# Altium footprint library Switches.PcbLib: 117 footprints (part 5 of 8)
Each footprint in its own frame and in the unit in brackets; x right, y up, seen from the top. Pads: shape width x height; smd on the part's side, far side on the other; paste and mask are expansions set on the pad; w line width, h text height; cw(c..) or ccw(c..) is an arc to the next point about the centre after c.
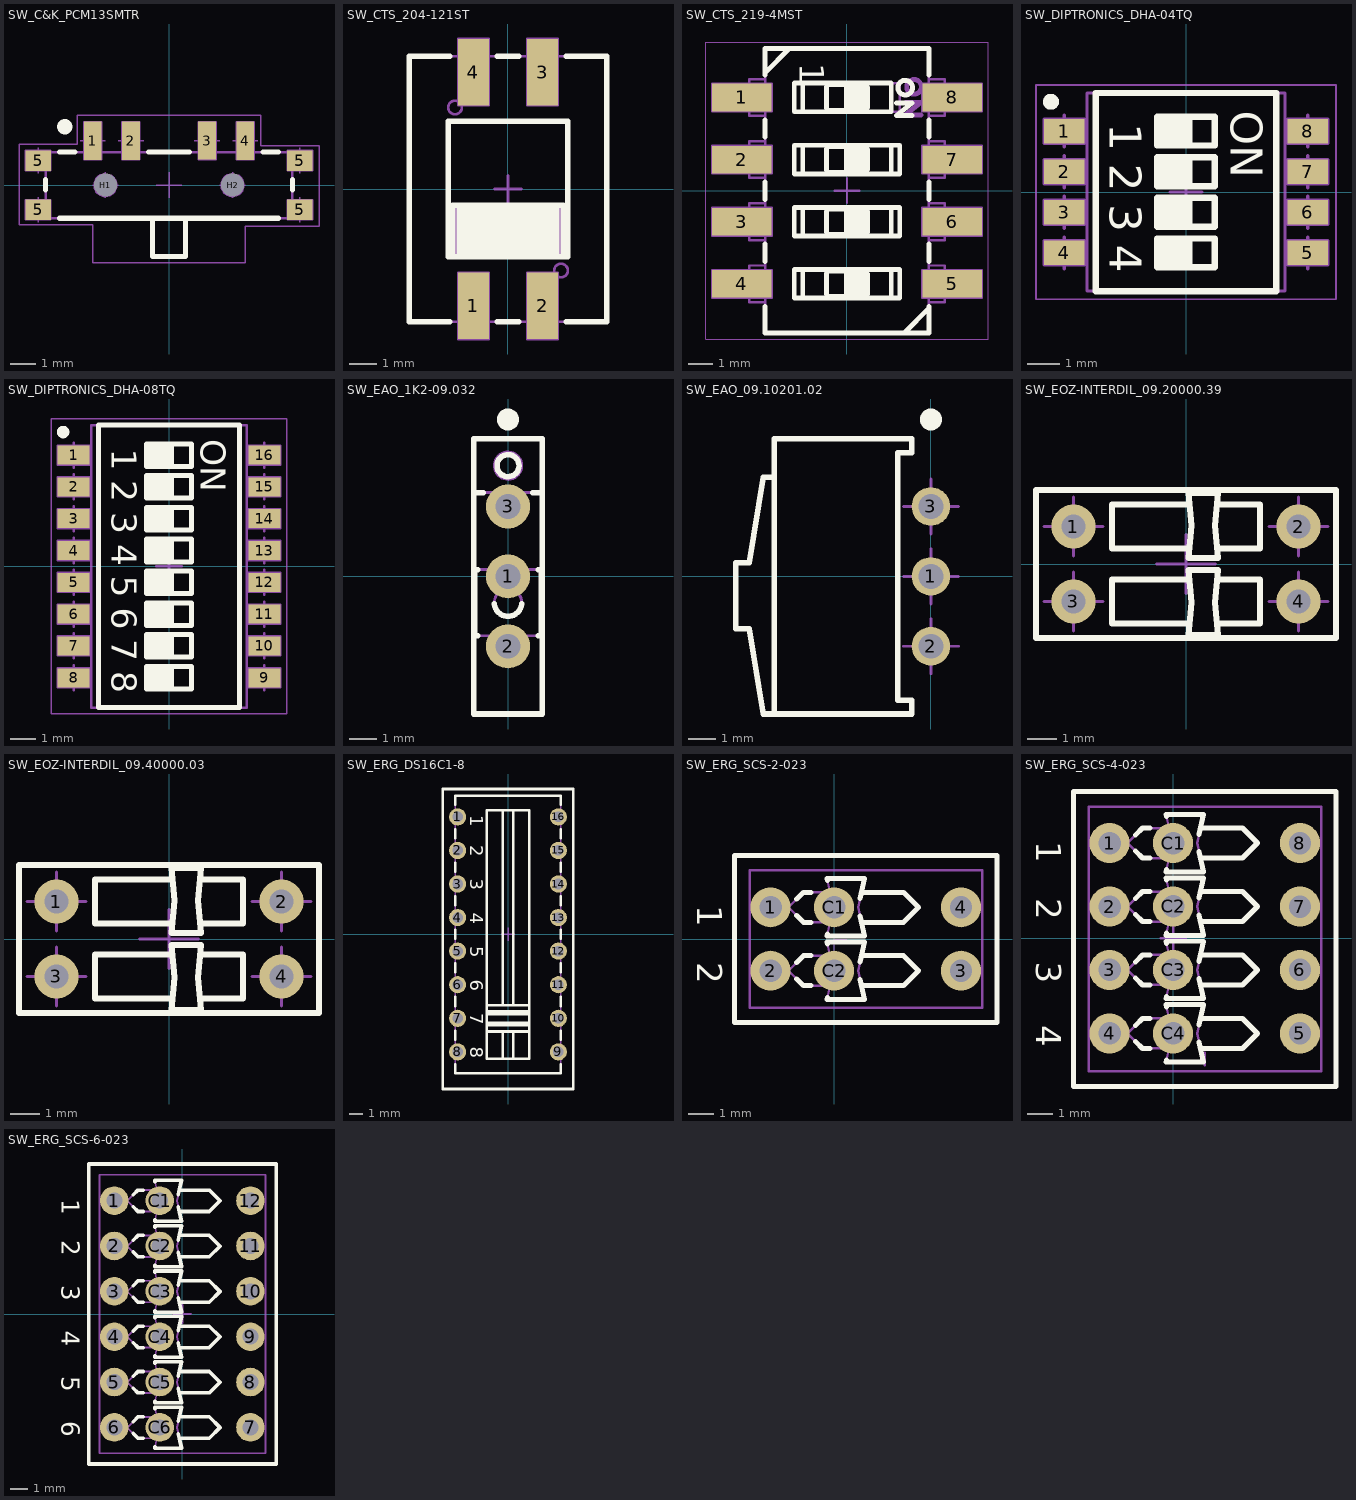
[diagram p4: the footprints below, top view; thin cyan lines are the x and y axes]

## SW_C&K_PCM13SMTR [mm] "SP3T, Right Angled Ultraminiature Surface Mount Slide Switches, C&K PCM Series"
height 1.4
pads (10):
  rect 0.7x1.5 smd: 1(-3,1.75) 2(-1.5,1.75) 3(1.5,1.754) 4(3,1.75)
  rect 1x0.8 smd: 5(-5.15,-0.965) 5(-5.15,0.965) 5(5.15,-0.965) 5(5.15,0.965)
  round 0.5 hole 0.9 unplated mask+0.2: H1(-2.5,0) H2(2.5,0)
Top Overlay:
  circle w0.3: c-4.1,2.3 r0.15
  lines w0.2: -4.85,-0.192 -4.85,0.215 ; -4.3,-1.3 4.3,-1.3 ; -4.3,1.3 -3.7,1.3 ; -0.8,1.3 0.8,1.3 ; -0.65,-1.3 -0.65,-2.8 0.65,-2.8 0.65,-1.3 ; 3.7,1.3 4.3,1.3 ; 4.85,-0.192 4.85,0.215
Mechanical 8:
  circle w0.05: c2.5,0 r0.45
  circle w0.05: c-2.5,0 r0.45
  lines w0.05: -5.65,-0.965 -5.15,-0.965 ; -5.65,0.965 -5.15,0.965 ; -5.15,-1.465 -5.15,-0.965 ; -5.15,-0.465 -5.15,-0.965 ; -5.15,0.465 -5.15,0.965 ; -5.15,1.465 -5.15,0.965 ; -4.65,-0.965 -5.15,-0.965 ; -4.65,0.965 -5.15,0.965 ; -3.5,1.75 -3,1.75 ; -3,0 -2.5,0 ; -3,1.25 -3,1.75 ; -3,2.25 -3,1.75 ; -2.5,-0.5 -2.5,0 ; -2.5,0.5 -2.5,0 ; -2.5,1.75 -3,1.75 ; -2,0 -2.5,0 ; -2,1.75 -1.5,1.75 ; -1.5,1.25 -1.5,1.75 ; -1.5,2.25 -1.5,1.75 ; -1,1.75 -1.5,1.75 ; -0.5,0 0,0 ; 0,-0.5 0,0 ; 0,0.5 0,0 ; 0.5,0 0,0 ; 1,1.754 1.5,1.754 ; 1.5,1.254 1.5,1.754 ; 1.5,2.254 1.5,1.754 ; 2,0 2.5,0 ; 2,1.754 1.5,1.754 ; 2.5,-0.5 2.5,0 ; 2.5,0.5 2.5,0 ; 2.5,1.75 3,1.75 ; 3,0 2.5,0 ; 3,1.25 3,1.75 ; 3,2.25 3,1.75 ; 3.5,1.75 3,1.75 ; 4.65,-0.965 5.15,-0.965 ; 4.65,0.965 5.15,0.965 ; 5.15,-1.465 5.15,-0.965 ; 5.15,-0.465 5.15,-0.965 ; 5.15,0.465 5.15,0.965 ; 5.15,1.465 5.15,0.965 ; 5.65,-0.965 5.15,-0.965 ; 5.65,0.965 5.15,0.965 ; -5.65,-1.365 -4.65,-1.365 -4.65,-0.565 -5.65,-0.565 -5.65,-1.365 ; -5.65,0.565 -5.65,1.365 -4.65,1.365 -4.65,0.565 -5.65,0.565 ; -3.35,1 -3.35,2.5 -2.65,2.5 -2.65,1 -3.35,1 ; -1.85,1 -1.85,2.5 -1.15,2.5 -1.15,1 -1.85,1 ; 1.15,1 1.15,2.5 1.85,2.5 1.85,1 1.15,1 ; 2.65,1 2.65,2.5 3.35,2.5 3.35,1 2.65,1 ; 4.65,-1.365 4.65,-0.565 5.65,-0.565 5.65,-1.365 4.65,-1.365 ; 4.65,0.565 4.65,1.365 5.65,1.365 5.65,0.565 4.65,0.565
Mechanical 14:
  lines w0.1: -4.85,-0.64 -5.35,-0.64 -5.35,-1.3 -4.85,-1.3 ; -4.85,0.64 -5.35,0.64 -5.35,1.3 -4.85,1.3 ; -3.2,1.3 -3.2,2.2 -2.8,2.2 -2.8,1.3 ; -1.7,1.3 -1.7,2.2 -1.3,2.2 -1.3,1.3 ; -0.65,-1.3 -0.65,-2.8 0.65,-2.8 0.65,-1.3 ; 1.3,1.3 1.3,2.2 1.7,2.2 1.7,1.3 ; 2.8,1.3 2.8,2.2 3.2,2.2 3.2,1.3 ; 4.85,-0.64 5.35,-0.64 5.35,-1.3 4.85,-1.3 ; 4.85,0.64 5.35,0.64 5.35,1.3 4.85,1.3 ; -4.85,-1.3 -4.85,1.3 ; -4.85,-1.3 4.85,-1.3 ; -4.85,1.3 4.85,1.3 ; 4.85,-1.3 4.85,1.3
Mechanical 15:
  lines w0.05: -5.9,-1.55 -5.9,1.615 -3.6,1.615 -3.6,2.75 3.6,2.75 3.6,1.55 5.9,1.55 5.9,-1.615 3,-1.615 3,-3.05 -3,-3.05 -3,-1.55 -5.9,-1.55
3D body "SW_C&K_PCM13SMTR.stp": height 1.4, standoff -0.5, extent -5.35,-2.8 5.35,2.2

## SW_CTS_204-121ST [mm] "Body 7.26 x 9.78mm SPST DIP Switch, 204 Series"
height 10.36
pads (4):
  rect 1.13x2.44 smd: 1(-1.27,-4.3) 2(1.27,-4.3) 3(1.27,4.3) 4(-1.27,4.3)
Top Overlay:
  lines w0.2: -2.135,-4.89 -3.63,-4.89 -3.63,4.89 -2.135,4.89 ; -2.03,-2.5 -2.03,-0.6 2.03,-0.6 2.03,-2.5 ; -1.8,-2.5 -1.8,-0.6 ; -1.6,-2.5 -1.6,-0.6 ; -1.4,-2.5 -1.4,-0.6 ; -1.2,-2.5 -1.2,-0.6 ; -1,-2.5 -1,-0.6 ; -0.8,-2.5 -0.8,-0.6 ; -0.6,-2.5 -0.6,-0.6 ; -0.405,-4.89 0.405,-4.89 ; -0.405,4.89 0.405,4.89 ; -0.4,-2.5 -0.4,-0.6 ; -0.2,-2.5 -0.2,-0.6 ; 0.2,-2.5 0.2,-0.6 ; 0.4,-2.5 0.4,-0.6 ; 0.6,-2.5 0.6,-0.6 ; 0.8,-2.5 0.8,-0.6 ; 1,-2.5 1,-0.6 ; 1.2,-2.5 1.2,-0.6 ; 1.4,-2.5 1.4,-0.6 ; 1.6,-2.5 1.6,-0.6 ; 1.8,-2.5 1.8,-0.6 ; 2.135,-4.89 3.63,-4.89 3.63,4.89 2.135,4.89 ; -2.2,-2.5 2.2,-2.5 2.2,2.5 -2.2,2.5 -2.2,-2.5 ; 0,-2.5 0,-0.6 0,-2.5
Mechanical 8:
  lines w0.1: -1.77,-4.3 -1.27,-4.3 ; -1.77,4.3 -1.27,4.3 ; -1.27,-4.8 -1.27,-4.3 ; -1.27,-3.8 -1.27,-4.3 ; -1.27,3.8 -1.27,4.3 ; -1.27,4.8 -1.27,4.3 ; -0.77,-4.3 -1.27,-4.3 ; -0.77,4.3 -1.27,4.3 ; -0.5,0 0,0 ; 0,-0.5 0,0 ; 0,0.5 0,0 ; 0.5,0 0,0 ; 0.77,-4.3 1.27,-4.3 ; 0.77,4.3 1.27,4.3 ; 1.27,-4.8 1.27,-4.3 ; 1.27,-3.8 1.27,-4.3 ; 1.27,3.8 1.27,4.3 ; 1.27,4.8 1.27,4.3 ; 1.77,-4.3 1.27,-4.3 ; 1.77,4.3 1.27,4.3 ; -1.835,-5.52 -0.705,-5.52 -0.705,-3.08 -1.835,-3.08 -1.835,-5.52 ; -1.835,3.08 -0.705,3.08 -0.705,5.52 -1.835,5.52 -1.835,3.08 ; 0.705,-5.52 1.835,-5.52 1.835,-3.08 0.705,-3.08 0.705,-5.52 ; 0.705,3.08 1.835,3.08 1.835,5.52 0.705,5.52 0.705,3.08
Mechanical 14:
  circle w0.1: c-1.95,3 r0.25
  circle w0.1: c1.95,-3 r0.25
  lines w0.1: -2.03,-2.5 -2.03,-0.6 2.03,-0.6 2.03,-2.5 ; -1.95,-2.5 -1.95,-0.6 ; -1.85,-2.5 -1.85,-0.6 ; -1.835,-4.89 -1.835,-5.52 -0.705,-5.52 -0.705,-4.89 ; -1.835,4.89 -1.835,5.52 -0.705,5.52 -0.705,4.89 ; -1.75,-2.5 -1.75,-0.6 ; -1.65,-2.5 -1.65,-0.6 ; -1.55,-2.5 -1.55,-0.6 ; -1.45,-2.5 -1.45,-0.6 ; -1.35,-2.5 -1.35,-0.6 ; -1.25,-2.5 -1.25,-0.6 ; -1.15,-2.5 -1.15,-0.6 ; -1.05,-2.5 -1.05,-0.6 ; -0.95,-2.5 -0.95,-0.6 ; -0.85,-2.5 -0.85,-0.6 ; -0.75,-2.5 -0.75,-0.6 ; -0.65,-2.5 -0.65,-0.6 ; -0.55,-2.5 -0.55,-0.6 ; -0.45,-2.5 -0.45,-0.6 ; -0.35,-2.5 -0.35,-0.6 ; -0.25,-2.5 -0.25,-0.6 ; -0.15,-2.5 -0.15,-0.6 ; -0.05,-2.5 -0.05,-0.6 ; 0.05,-2.5 0.05,-0.6 ; 0.15,-2.5 0.15,-0.6 ; 0.25,-2.5 0.25,-0.6 ; 0.35,-2.5 0.35,-0.6 ; 0.45,-2.5 0.45,-0.6 ; 0.55,-2.5 0.55,-0.6 ; 0.65,-2.5 0.65,-0.6 ; 0.705,-4.89 0.705,-5.52 1.835,-5.52 1.835,-4.89 ; 0.705,4.89 0.705,5.52 1.835,5.52 1.835,4.89 ; 0.75,-2.5 0.75,-0.6 ; 0.85,-2.5 0.85,-0.6 ; 0.95,-2.5 0.95,-0.6 ; 1.05,-2.5 1.05,-0.6 ; 1.15,-2.5 1.15,-0.6 ; 1.25,-2.5 1.25,-0.6 ; 1.35,-2.5 1.35,-0.6 ; 1.45,-2.5 1.45,-0.6 ; 1.55,-2.5 1.55,-0.6 ; 1.65,-2.5 1.65,-0.6 ; 1.75,-2.5 1.75,-0.6 ; 1.85,-2.5 1.85,-0.6 ; 1.95,-2.5 1.95,-0.6 ; -3.63,-4.89 3.63,-4.89 3.63,4.89 -3.63,4.89 -3.63,-4.89 ; -2.2,-2.5 2.2,-2.5 2.2,2.5 -2.2,2.5 -2.2,-2.5
3D body "SW_CTS_204-121ST.stp": height 10.36, standoff 0, extent -3.63,-5.2 3.63,5.2

## SW_CTS_219-4MST [mm] "Pitch 2.54mm, Body 6.7 x 11.63mm, 4 Ways SPST Surface-Mounting DIP Switch, CTS 219 Series"
height 4.23
pads (8):
  rect 2.44x1.13 smd: 1(-4.3,3.81) 2(-4.3,1.27) 3(-4.3,-1.27) 4(-4.3,-3.81) 5(4.3,-3.81) 6(4.3,-1.27) 7(4.3,1.27) 8(4.3,3.81)
Top Overlay:
  circle w0.2: c2.38,4.211 r0.3
  lines w0.1: -0.84,-4.235 ccw(c-0.74,-4.235) -0.74,-4.335 ; -0.84,-3.385 cw(c-0.74,-3.385) -0.74,-3.285 ; -0.84,-1.695 ccw(c-0.74,-1.695) -0.74,-1.795 ; -0.84,-0.845 cw(c-0.74,-0.845) -0.74,-0.745 ; -0.84,0.845 ccw(c-0.74,0.845) -0.74,0.745 ; -0.84,1.695 cw(c-0.74,1.695) -0.74,1.795 ; -0.84,3.385 ccw(c-0.74,3.385) -0.74,3.285 ; -0.84,4.235 cw(c-0.74,4.235) -0.74,4.335 ; -0.02,-4.21 ccw(c0.08,-4.21) 0.08,-4.31 ; -0.02,-3.41 cw(c0.08,-3.41) 0.08,-3.31 ; -0.02,-1.67 ccw(c0.08,-1.67) 0.08,-1.77 ; -0.02,-0.87 cw(c0.08,-0.87) 0.08,-0.77 ; -0.02,0.87 ccw(c0.08,0.87) 0.08,0.77 ; -0.02,1.67 cw(c0.08,1.67) 0.08,1.77 ; -0.02,3.41 ccw(c0.08,3.41) 0.08,3.31 ; -0.02,4.21 cw(c0.08,4.21) 0.08,4.31 ; 0.739,-4.31 ccw(c0.739,-4.21) 0.839,-4.21 ; 0.739,-3.31 cw(c0.739,-3.41) 0.839,-3.41 ; 0.739,-1.77 ccw(c0.739,-1.67) 0.839,-1.67 ; 0.739,-0.77 cw(c0.739,-0.87) 0.839,-0.87 ; 0.739,0.77 ccw(c0.739,0.87) 0.839,0.87 ; 0.739,1.77 cw(c0.739,1.67) 0.839,1.67 ; 0.739,3.31 ccw(c0.739,3.41) 0.839,3.41 ; 0.739,4.31 cw(c0.739,4.21) 0.839,4.21 ; 0.74,-4.335 ccw(c0.74,-4.235) 0.839,-4.223 ; 0.74,-3.285 cw(c0.74,-3.385) 0.839,-3.398 ; 0.74,-1.795 ccw(c0.74,-1.695) 0.839,-1.683 ; 0.74,-0.745 cw(c0.74,-0.845) 0.839,-0.857 ; 0.74,0.745 ccw(c0.74,0.845) 0.839,0.857 ; 0.74,1.795 cw(c0.74,1.695) 0.839,1.683 ; 0.74,3.285 ccw(c0.74,3.385) 0.839,3.398 ; 0.74,4.335 cw(c0.74,4.235) 0.839,4.223
  lines w0.2: -3.35,-4.725 -3.35,-5.815 3.35,-5.815 3.35,-4.725 ; -3.35,-2.895 -3.35,-2.185 ; -3.35,-0.355 -3.35,0.355 ; -3.35,2.185 -3.35,2.895 ; -3.35,4.725 -3.35,5.815 3.35,5.815 3.35,4.725 ; -3.35,4.815 -2.35,5.815 ; -1.81,-4.395 -1.81,-3.225 ; -1.81,-1.855 -1.81,-0.685 ; -1.81,0.685 -1.81,1.855 ; -1.81,3.225 -1.81,4.395 ; -0.84,-4.235 -0.84,-3.385 ; -0.84,-1.695 -0.84,-0.845 ; -0.84,0.845 -0.84,1.695 ; -0.84,3.385 -0.84,4.235 ; -0.74,-4.335 0.74,-4.335 ; -0.74,-3.285 0.74,-3.285 ; -0.74,-1.795 0.74,-1.795 ; -0.74,-0.745 0.74,-0.745 ; -0.74,0.745 0.74,0.745 ; -0.74,1.795 0.74,1.795 ; -0.74,3.285 0.74,3.285 ; -0.74,4.335 0.74,4.335 ; -0.02,-4.21 -0.02,-3.41 ; -0.02,-1.67 -0.02,-0.87 ; -0.02,0.87 -0.02,1.67 ; -0.02,3.41 -0.02,4.21 ; 0.08,-4.31 0.739,-4.31 ; 0.08,-3.31 0.739,-3.31 ; 0.08,-1.77 0.739,-1.77 ; 0.08,-0.77 0.739,-0.77 ; 0.08,0.77 0.739,0.77 ; 0.08,1.77 0.739,1.77 ; 0.08,3.31 0.739,3.31 ; 0.08,4.31 0.739,4.31 ; 0.18,-4.31 0.18,-3.31 ; 0.18,-1.77 0.18,-0.77 ; 0.18,0.77 0.18,1.77 ; 0.18,3.31 0.18,4.31 ; 0.38,-4.31 0.38,-3.31 ; 0.38,-1.77 0.38,-0.77 ; 0.38,0.77 0.38,1.77 ; 0.38,3.31 0.38,4.31 ; 0.58,-4.31 0.58,-3.31 ; 0.58,-1.77 0.58,-0.77 ; 0.58,0.77 0.58,1.77 ; 0.58,3.31 0.58,4.31 ; 0.78,-4.301 0.78,-3.319 ; 0.78,-1.761 0.78,-0.779 ; 0.78,0.779 0.78,1.761 ; 0.78,3.319 0.78,4.301 ; 0.839,-4.223 0.84,-4.216 0.84,-4.21 ; 0.839,-3.398 0.84,-3.404 0.84,-3.41 ; 0.839,-1.683 0.84,-1.676 0.84,-1.67 ; 0.839,-0.858 0.84,-0.864 0.84,-0.87 ; 0.839,0.858 0.84,0.864 0.84,0.87 ; 0.839,1.683 0.84,1.676 0.84,1.67 ; 0.839,3.398 0.84,3.404 0.84,3.41 ; 0.839,4.223 0.84,4.216 0.84,4.21 ; 1.81,-4.395 1.81,-3.225 ; 1.81,-1.855 1.81,-0.685 ; 1.81,0.685 1.81,1.855 ; 2.022,3.576 2.657,3.576 2.022,3.068 2.657,3.068 ; 2.35,-5.815 3.35,-4.815 ; 3.35,-2.895 3.35,-2.185 ; 3.35,-0.355 3.35,0.355 ; 3.35,2.185 3.35,2.895 ; 0.84,-4.21 0.84,-3.41 ; 0.839,-4.21 0.839,-3.41 ; 0.84,-1.67 0.84,-0.87 ; 0.839,-1.67 0.839,-0.87 ; 0.84,0.87 0.84,1.67 ; 0.839,0.87 0.839,1.67 ; 0.84,3.41 0.84,4.21 ; 0.839,3.41 0.839,4.21 ; -2.155,-4.395 2.155,-4.395 2.155,-3.225 -2.155,-3.225 -2.155,-4.395 ; -2.155,-1.855 2.155,-1.855 2.155,-0.685 -2.155,-0.685 -2.155,-1.855 ; -2.155,0.685 2.155,0.685 2.155,1.855 -2.155,1.855 -2.155,0.685 ; -2.155,3.225 1.81,3.225 1.81,4.395 -2.155,4.395 -2.155,3.225
  text "1" at -1.925,5.2 h1
Mechanical 8:
  lines w0.1: -4.8,-3.81 -4.3,-3.81 ; -4.8,-1.27 -4.3,-1.27 ; -4.8,1.27 -4.3,1.27 ; -4.8,3.81 -4.3,3.81 ; -4.3,-4.31 -4.3,-3.81 ; -4.3,-3.31 -4.3,-3.81 ; -4.3,-1.77 -4.3,-1.27 ; -4.3,-0.77 -4.3,-1.27 ; -4.3,0.77 -4.3,1.27 ; -4.3,1.77 -4.3,1.27 ; -4.3,3.31 -4.3,3.81 ; -4.3,4.31 -4.3,3.81 ; -3.8,-3.81 -4.3,-3.81 ; -3.8,-1.27 -4.3,-1.27 ; -3.8,1.27 -4.3,1.27 ; -3.8,3.81 -4.3,3.81 ; -0.5,0 0,0 ; 0,-0.5 0,0 ; 0,0.5 0,0 ; 0.5,0 0,0 ; 3.8,-3.81 4.3,-3.81 ; 3.8,-1.27 4.3,-1.27 ; 3.8,1.27 4.3,1.27 ; 3.8,3.81 4.3,3.81 ; 4.3,-4.31 4.3,-3.81 ; 4.3,-3.31 4.3,-3.81 ; 4.3,-1.77 4.3,-1.27 ; 4.3,-0.77 4.3,-1.27 ; 4.3,0.77 4.3,1.27 ; 4.3,1.77 4.3,1.27 ; 4.3,3.31 4.3,3.81 ; 4.3,4.31 4.3,3.81 ; 4.8,-3.81 4.3,-3.81 ; 4.8,-1.27 4.3,-1.27 ; 4.8,1.27 4.3,1.27 ; 4.8,3.81 4.3,3.81 ; -5.52,-4.375 -5.52,-3.245 -3.08,-3.245 -3.08,-4.375 -5.52,-4.375 ; -5.52,-1.835 -5.52,-0.705 -3.08,-0.705 -3.08,-1.835 -5.52,-1.835 ; -5.52,0.705 -5.52,1.835 -3.08,1.835 -3.08,0.705 -5.52,0.705 ; -5.52,3.245 -5.52,4.375 -3.08,4.375 -3.08,3.245 -5.52,3.245 ; 3.08,-4.375 3.08,-3.245 5.52,-3.245 5.52,-4.375 3.08,-4.375 ; 3.08,-1.835 3.08,-0.705 5.52,-0.705 5.52,-1.835 3.08,-1.835 ; 3.08,0.705 3.08,1.835 5.52,1.835 5.52,0.705 3.08,0.705 ; 3.08,3.245 3.08,4.375 5.52,4.375 5.52,3.245 3.08,3.245
Mechanical 14:
  drawing of 202 lines, arcs and shapes, not listed
  text "1" at -1.925,5.2 h1
Mechanical 15:
  lines w0.05: -5.77,-6.065 5.77,-6.065 5.77,6.065 -5.77,6.065 -5.77,-6.065
3D body "SW_CTS_219-4MST.stp": height 4.3, standoff 0, extent -4.955,-5.815 4.955,5.815

## SW_DIPTRONICS_DHA-04TQ [mm] "Pitch 1.27mm,  Body 6.2x6.21mm, 4 Ways SPST Surface-Mount DIP Switch, DIPTRONICS DHA Series"
height 2.3
pads (8):
  rect 1.27x0.76 smd: 1(-3.81,1.905) 2(-3.81,0.635) 3(-3.81,-0.635) 4(-3.81,-1.905) 5(3.81,-1.905) 6(3.81,-0.635) 7(3.81,0.635) 8(3.81,1.905)
Top Overlay:
  circle w0.25: c-4.225,2.825 r0.125
  lines w0.2: -0.8,-2.355 -0.8,-1.455 ; -0.8,-1.085 -0.8,-0.185 ; -0.8,0.185 -0.8,1.085 ; -0.8,1.455 -0.8,2.355 ; -0.7,-2.355 -0.7,-1.455 ; -0.7,-1.085 -0.7,-0.185 ; -0.7,0.185 -0.7,1.085 ; -0.7,1.455 -0.7,2.355 ; -0.6,-2.355 -0.6,-1.455 ; -0.6,-1.085 -0.6,-0.185 ; -0.6,0.185 -0.6,1.085 ; -0.6,1.455 -0.6,2.355 ; -0.5,-2.355 -0.5,-1.455 ; -0.5,-1.085 -0.5,-0.185 ; -0.5,0.185 -0.5,1.085 ; -0.5,1.455 -0.5,2.355 ; -0.4,-2.355 -0.4,-1.455 ; -0.4,-1.085 -0.4,-0.185 ; -0.4,0.185 -0.4,1.085 ; -0.4,1.455 -0.4,2.355 ; -0.3,-2.355 -0.3,-1.455 ; -0.3,-1.085 -0.3,-0.185 ; -0.3,0.185 -0.3,1.085 ; -0.3,1.455 -0.3,2.355 ; -0.2,-2.355 -0.2,-1.455 ; -0.2,-1.085 -0.2,-0.185 ; -0.2,0.185 -0.2,1.085 ; -0.2,1.455 -0.2,2.355 ; -0.1,-2.355 -0.1,-1.455 ; -0.1,-1.085 -0.1,-0.185 ; -0.1,0.185 -0.1,1.085 ; -0.1,1.455 -0.1,2.355 ; 0,-2.355 0,-1.455 ; 0,-1.085 0,-0.185 ; 0,0.185 0,1.085 ; 0,1.455 0,2.355 ; 0.1,-2.355 0.1,-1.455 ; 0.1,-1.085 0.1,-0.185 ; 0.1,0.185 0.1,1.085 ; 0.1,1.455 0.1,2.355 ; -0.9,-2.355 0.9,-2.355 0.9,-1.455 -0.9,-1.455 ; -0.9,-2.355 -0.9,-1.455 ; -0.9,-2.355 -0.9,-1.455 ; -0.9,-1.085 0.9,-1.085 0.9,-0.185 -0.9,-0.185 ; -0.9,-1.085 -0.9,-0.185 ; -0.9,-1.085 -0.9,-0.185 ; -0.9,0.185 0.9,0.185 0.9,1.085 -0.9,1.085 ; -0.9,0.185 -0.9,1.085 ; -0.9,0.185 -0.9,1.085 ; -0.9,1.455 0.9,1.455 0.9,2.355 -0.9,2.355 ; -0.9,1.455 -0.9,2.355 ; -0.9,1.455 -0.9,2.355 ; -2.82,-3.101 -2.82,3.099 2.82,3.099 2.82,-3.101 -2.82,-3.101
  text "ON" at 1.395,2.54 h1
  text "2" at -2.381,0.89 h1
  text "4" at -2.381,-1.65 h1
  text "3" at -2.381,-0.38 h1
  text "1" at -2.381,2.16 h1
Mechanical 8:
  lines w0.1: -4.31,-1.905 -3.81,-1.905 ; -4.31,-0.635 -3.81,-0.635 ; -4.31,0.635 -3.81,0.635 ; -4.31,1.905 -3.81,1.905 ; -3.81,-2.405 -3.81,-1.905 ; -3.81,-1.405 -3.81,-1.905 ; -3.81,-1.135 -3.81,-0.635 ; -3.81,-0.135 -3.81,-0.635 ; -3.81,0.135 -3.81,0.635 ; -3.81,1.135 -3.81,0.635 ; -3.81,1.405 -3.81,1.905 ; -3.81,2.405 -3.81,1.905 ; -3.31,-1.905 -3.81,-1.905 ; -3.31,-0.635 -3.81,-0.635 ; -3.31,0.635 -3.81,0.635 ; -3.31,1.905 -3.81,1.905 ; -0.5,0 0,0 ; 0,-0.5 0,0 ; 0,0.5 0,0 ; 0.5,0 0,0 ; 3.31,-1.905 3.81,-1.905 ; 3.31,-0.635 3.81,-0.635 ; 3.31,0.635 3.81,0.635 ; 3.31,1.905 3.81,1.905 ; 3.81,-2.405 3.81,-1.905 ; 3.81,-1.405 3.81,-1.905 ; 3.81,-1.135 3.81,-0.635 ; 3.81,-0.135 3.81,-0.635 ; 3.81,0.135 3.81,0.635 ; 3.81,1.135 3.81,0.635 ; 3.81,1.405 3.81,1.905 ; 3.81,2.405 3.81,1.905 ; 4.31,-1.905 3.81,-1.905 ; 4.31,-0.635 3.81,-0.635 ; 4.31,0.635 3.81,0.635 ; 4.31,1.905 3.81,1.905 ; -4.445,-2.285 -4.445,-1.525 -3.175,-1.525 -3.175,-2.285 -4.445,-2.285 ; -4.445,-1.015 -4.445,-0.255 -3.175,-0.255 -3.175,-1.015 -4.445,-1.015 ; -4.445,0.255 -4.445,1.015 -3.175,1.015 -3.175,0.255 -4.445,0.255 ; -4.445,1.525 -4.445,2.285 -3.175,2.285 -3.175,1.525 -4.445,1.525 ; 3.175,-2.285 4.445,-2.285 4.445,-1.525 3.175,-1.525 3.175,-2.285 ; 3.175,-1.015 4.445,-1.015 4.445,-0.255 3.175,-0.255 3.175,-1.015 ; 3.175,0.255 4.445,0.255 4.445,1.015 3.175,1.015 3.175,0.255 ; 3.175,1.525 4.445,1.525 4.445,2.285 3.175,2.285 3.175,1.525
Mechanical 14:
  lines w0.1: -0.8,-2.355 -0.8,-1.455 ; -0.8,-1.085 -0.8,-0.185 ; -0.8,0.185 -0.8,1.085 ; -0.8,1.455 -0.8,2.355 ; -0.7,-2.355 -0.7,-1.455 ; -0.7,-1.085 -0.7,-0.185 ; -0.7,0.185 -0.7,1.085 ; -0.7,1.455 -0.7,2.355 ; -0.6,-2.355 -0.6,-1.455 ; -0.6,-1.085 -0.6,-0.185 ; -0.6,0.185 -0.6,1.085 ; -0.6,1.455 -0.6,2.355 ; -0.5,-2.355 -0.5,-1.455 ; -0.5,-1.085 -0.5,-0.185 ; -0.5,0.185 -0.5,1.085 ; -0.5,1.455 -0.5,2.355 ; -0.4,-2.355 -0.4,-1.455 ; -0.4,-1.085 -0.4,-0.185 ; -0.4,0.185 -0.4,1.085 ; -0.4,1.455 -0.4,2.355 ; -0.3,-2.355 -0.3,-1.455 ; -0.3,-1.085 -0.3,-0.185 ; -0.3,0.185 -0.3,1.085 ; -0.3,1.455 -0.3,2.355 ; -0.2,-2.355 -0.2,-1.455 ; -0.2,-1.085 -0.2,-0.185 ; -0.2,0.185 -0.2,1.085 ; -0.2,1.455 -0.2,2.355 ; -0.1,-2.355 -0.1,-1.455 ; -0.1,-1.085 -0.1,-0.185 ; -0.1,0.185 -0.1,1.085 ; -0.1,1.455 -0.1,2.355 ; 0,-2.355 0,-1.455 ; 0,-1.085 0,-0.185 ; 0,0.185 0,1.085 ; 0,1.455 0,2.355 ; 0.1,-2.355 0.1,-1.455 ; 0.1,-1.085 0.1,-0.185 ; 0.1,0.185 0.1,1.085 ; 0.1,1.455 0.1,2.355 ; -0.9,-2.355 0.9,-2.355 0.9,-1.455 -0.9,-1.455 ; -0.9,-2.355 -0.9,-1.455 ; -0.9,-2.355 -0.9,-1.455 ; -0.9,-1.085 0.9,-1.085 0.9,-0.185 -0.9,-0.185 ; -0.9,-1.085 -0.9,-0.185 ; -0.9,-1.085 -0.9,-0.185 ; -0.9,0.185 0.9,0.185 0.9,1.085 -0.9,1.085 ; -0.9,0.185 -0.9,1.085 ; -0.9,0.185 -0.9,1.085 ; -0.9,1.455 0.9,1.455 0.9,2.355 -0.9,2.355 ; -0.9,1.455 -0.9,2.355 ; -0.9,1.455 -0.9,2.355 ; -3.1,-3.101 -3.1,3.099 3.1,3.099 3.1,-3.101 -3.1,-3.101
  text "1" at -2.376,2.159 h1
  text "ON" at 1.405,2.54 h1
  text "3" at -2.376,-0.381 h1
  text "4" at -2.376,-1.651 h1
  text "2" at -2.376,0.889 h1
Mechanical 15:
  lines w0.05: -4.695,-3.351 4.695,-3.351 4.695,3.349 -4.695,3.349 -4.695,-3.351
3D body "SW_DIPTRONICS_DHA-04TQ.stp": height 2.36, standoff 0, extent -4.05,-3.101 4.051,3.099

## SW_DIPTRONICS_DHA-08TQ [mm] "Pitch 1.27mm,  Body 6.2x11.29mm, 8 Ways SPST Surface-Mount DIP Switch, DIPTRONICS DHA Series"
height 2.3
pads (16):
  rect 1.27x0.76 smd: 1(-3.81,4.441) 2(-3.81,3.171) 3(-3.81,1.901) 4(-3.81,0.631) 5(-3.81,-0.639) 6(-3.81,-1.909) 7(-3.81,-3.179) 8(-3.81,-4.449) 9(3.81,-4.449) 10(3.81,-3.179) 11(3.81,-1.909) 12(3.81,-0.639) 13(3.81,0.631) 14(3.81,1.901) 15(3.81,3.171) 16(3.81,4.441)
Top Overlay:
  circle w0.25: c-4.225,5.361 r0.125
  lines w0.2: -0.8,-4.899 -0.8,-3.999 ; -0.8,-3.629 -0.8,-2.729 ; -0.8,-2.359 -0.8,-1.459 ; -0.8,-1.089 -0.8,-0.189 ; -0.8,0.181 -0.8,1.081 ; -0.8,1.451 -0.8,2.351 ; -0.8,2.721 -0.8,3.621 ; -0.8,3.991 -0.8,4.891 ; -0.7,-4.899 -0.7,-3.999 ; -0.7,-3.629 -0.7,-2.729 ; -0.7,-2.359 -0.7,-1.459 ; -0.7,-1.089 -0.7,-0.189 ; -0.7,0.181 -0.7,1.081 ; -0.7,1.451 -0.7,2.351 ; -0.7,2.721 -0.7,3.621 ; -0.7,3.991 -0.7,4.891 ; -0.6,-4.899 -0.6,-3.999 ; -0.6,-3.629 -0.6,-2.729 ; -0.6,-2.359 -0.6,-1.459 ; -0.6,-1.089 -0.6,-0.189 ; -0.6,0.181 -0.6,1.081 ; -0.6,1.451 -0.6,2.351 ; -0.6,2.721 -0.6,3.621 ; -0.6,3.991 -0.6,4.891 ; -0.5,-4.899 -0.5,-3.999 ; -0.5,-3.629 -0.5,-2.729 ; -0.5,-2.359 -0.5,-1.459 ; -0.5,-1.089 -0.5,-0.189 ; -0.5,0.181 -0.5,1.081 ; -0.5,1.451 -0.5,2.351 ; -0.5,2.721 -0.5,3.621 ; -0.5,3.991 -0.5,4.891 ; -0.4,-4.899 -0.4,-3.999 ; -0.4,-3.629 -0.4,-2.729 ; -0.4,-2.359 -0.4,-1.459 ; -0.4,-1.089 -0.4,-0.189 ; -0.4,0.181 -0.4,1.081 ; -0.4,1.451 -0.4,2.351 ; -0.4,2.721 -0.4,3.621 ; -0.4,3.991 -0.4,4.891 ; -0.3,-4.899 -0.3,-3.999 ; -0.3,-3.629 -0.3,-2.729 ; -0.3,-2.359 -0.3,-1.459 ; -0.3,-1.089 -0.3,-0.189 ; -0.3,0.181 -0.3,1.081 ; -0.3,1.451 -0.3,2.351 ; -0.3,2.721 -0.3,3.621 ; -0.3,3.991 -0.3,4.891 ; -0.2,-4.899 -0.2,-3.999 ; -0.2,-3.629 -0.2,-2.729 ; -0.2,-2.359 -0.2,-1.459 ; -0.2,-1.089 -0.2,-0.189 ; -0.2,0.181 -0.2,1.081 ; -0.2,1.451 -0.2,2.351 ; -0.2,2.721 -0.2,3.621 ; -0.2,3.991 -0.2,4.891 ; -0.1,-4.899 -0.1,-3.999 ; -0.1,-3.629 -0.1,-2.729 ; -0.1,-2.359 -0.1,-1.459 ; -0.1,-1.089 -0.1,-0.189 ; -0.1,0.181 -0.1,1.081 ; -0.1,1.451 -0.1,2.351 ; -0.1,2.721 -0.1,3.621 ; -0.1,3.991 -0.1,4.891 ; 0,-4.899 0,-3.999 ; 0,-3.629 0,-2.729 ; 0,-2.359 0,-1.459 ; 0,-1.089 0,-0.189 ; 0,0.181 0,1.081 ; 0,1.451 0,2.351 ; 0,2.721 0,3.621 ; 0,3.991 0,4.891 ; 0.1,-4.899 0.1,-3.999 ; 0.1,-3.629 0.1,-2.729 ; 0.1,-2.359 0.1,-1.459 ; 0.1,-1.089 0.1,-0.189 ; 0.1,0.181 0.1,1.081 ; 0.1,1.451 0.1,2.351 ; 0.1,2.721 0.1,3.621 ; 0.1,3.991 0.1,4.891 ; -0.9,-4.899 -0.9,-3.999 ; -0.9,-4.899 0.9,-4.899 0.9,-3.999 -0.9,-3.999 ; -0.9,-4.899 -0.9,-3.999 ; -0.9,-3.629 -0.9,-2.729 ; -0.9,-3.629 0.9,-3.629 0.9,-2.729 -0.9,-2.729 ; -0.9,-3.629 -0.9,-2.729 ; -0.9,-2.359 -0.9,-1.459 ; -0.9,-2.359 0.9,-2.359 0.9,-1.459 -0.9,-1.459 ; -0.9,-2.359 -0.9,-1.459 ; -0.9,-1.089 -0.9,-0.189 ; -0.9,-1.089 0.9,-1.089 0.9,-0.189 -0.9,-0.189 ; -0.9,-1.089 -0.9,-0.189 ; -0.9,0.181 -0.9,1.081 ; -0.9,0.181 -0.9,1.081 ; -0.9,0.181 0.9,0.181 0.9,1.081 -0.9,1.081 ; -0.9,1.451 -0.9,2.351 ; -0.9,1.451 -0.9,2.351 ; -0.9,1.451 0.9,1.451 0.9,2.351 -0.9,2.351 ; -0.9,2.721 -0.9,3.621 ; -0.9,2.721 -0.9,3.621 ; -0.9,2.721 0.9,2.721 0.9,3.621 -0.9,3.621 ; -0.9,3.991 -0.9,4.891 ; -0.9,3.991 -0.9,4.891 ; -0.9,3.991 0.9,3.991 0.9,4.891 -0.9,4.891 ; -2.82,-5.645 2.82,-5.645 2.82,5.635 -2.82,5.635 -2.82,-5.645
  text "1" at -2.286,4.699 h1
  text "2" at -2.286,3.429 h1
  text "ON" at 1.27,5.08 h1
  text "3" at -2.286,2.159 h1
  text "4" at -2.286,0.889 h1
  text "5" at -2.286,-0.381 h1
  text "6" at -2.286,-1.651 h1
  text "7" at -2.286,-2.921 h1
  text "8" at -2.286,-4.191 h1
Mechanical 8:
  lines w0.1: -4.31,-4.449 -3.81,-4.449 ; -4.31,-3.179 -3.81,-3.179 ; -4.31,-1.909 -3.81,-1.909 ; -4.31,-0.639 -3.81,-0.639 ; -4.31,0.631 -3.81,0.631 ; -4.31,1.901 -3.81,1.901 ; -4.31,3.171 -3.81,3.171 ; -4.31,4.441 -3.81,4.441 ; -3.81,-4.949 -3.81,-4.449 ; -3.81,-3.949 -3.81,-4.449 ; -3.81,-3.679 -3.81,-3.179 ; -3.81,-2.679 -3.81,-3.179 ; -3.81,-2.409 -3.81,-1.909 ; -3.81,-1.409 -3.81,-1.909 ; -3.81,-1.139 -3.81,-0.639 ; -3.81,-0.139 -3.81,-0.639 ; -3.81,0.131 -3.81,0.631 ; -3.81,1.131 -3.81,0.631 ; -3.81,1.401 -3.81,1.901 ; -3.81,2.401 -3.81,1.901 ; -3.81,2.671 -3.81,3.171 ; -3.81,3.671 -3.81,3.171 ; -3.81,3.941 -3.81,4.441 ; -3.81,4.941 -3.81,4.441 ; -3.31,-4.449 -3.81,-4.449 ; -3.31,-3.179 -3.81,-3.179 ; -3.31,-1.909 -3.81,-1.909 ; -3.31,-0.639 -3.81,-0.639 ; -3.31,0.631 -3.81,0.631 ; -3.31,1.901 -3.81,1.901 ; -3.31,3.171 -3.81,3.171 ; -3.31,4.441 -3.81,4.441 ; -0.5,0 0,0 ; 0,-0.5 0,0 ; 0,0.5 0,0 ; 0.5,0 0,0 ; 3.31,-4.449 3.81,-4.449 ; 3.31,-3.179 3.81,-3.179 ; 3.31,-1.909 3.81,-1.909 ; 3.31,-0.639 3.81,-0.639 ; 3.31,0.631 3.81,0.631 ; 3.31,1.901 3.81,1.901 ; 3.31,3.171 3.81,3.171 ; 3.31,4.441 3.81,4.441 ; 3.81,-4.949 3.81,-4.449 ; 3.81,-3.949 3.81,-4.449 ; 3.81,-3.679 3.81,-3.179 ; 3.81,-2.679 3.81,-3.179 ; 3.81,-2.409 3.81,-1.909 ; 3.81,-1.409 3.81,-1.909 ; 3.81,-1.139 3.81,-0.639 ; 3.81,-0.139 3.81,-0.639 ; 3.81,0.131 3.81,0.631 ; 3.81,1.131 3.81,0.631 ; 3.81,1.401 3.81,1.901 ; 3.81,2.401 3.81,1.901 ; 3.81,2.671 3.81,3.171 ; 3.81,3.671 3.81,3.171 ; 3.81,3.941 3.81,4.441 ; 3.81,4.941 3.81,4.441 ; 4.31,-4.449 3.81,-4.449 ; 4.31,-3.179 3.81,-3.179 ; 4.31,-1.909 3.81,-1.909 ; 4.31,-0.639 3.81,-0.639 ; 4.31,0.631 3.81,0.631 ; 4.31,1.901 3.81,1.901 ; 4.31,3.171 3.81,3.171 ; 4.31,4.441 3.81,4.441 ; -4.445,-4.829 -3.175,-4.829 -3.175,-4.069 -4.445,-4.069 -4.445,-4.829 ; -4.445,-3.559 -3.175,-3.559 -3.175,-2.799 -4.445,-2.799 -4.445,-3.559 ; -4.445,-2.289 -3.175,-2.289 -3.175,-1.529 -4.445,-1.529 -4.445,-2.289 ; -4.445,-1.019 -3.175,-1.019 -3.175,-0.259 -4.445,-0.259 -4.445,-1.019 ; -4.445,0.251 -3.175,0.251 -3.175,1.011 -4.445,1.011 -4.445,0.251 ; -4.445,1.521 -3.175,1.521 -3.175,2.281 -4.445,2.281 -4.445,1.521 ; -4.445,2.791 -3.175,2.791 -3.175,3.551 -4.445,3.551 -4.445,2.791 ; -4.445,4.061 -3.175,4.061 -3.175,4.821 -4.445,4.821 -4.445,4.061 ; 3.175,-4.829 3.175,-4.069 4.445,-4.069 4.445,-4.829 3.175,-4.829 ; 3.175,-3.559 3.175,-2.799 4.445,-2.799 4.445,-3.559 3.175,-3.559 ; 3.175,-2.289 3.175,-1.529 4.445,-1.529 4.445,-2.289 3.175,-2.289 ; 3.175,-1.019 3.175,-0.259 4.445,-0.259 4.445,-1.019 3.175,-1.019 ; 3.175,0.251 3.175,1.011 4.445,1.011 4.445,0.251 3.175,0.251 ; 3.175,1.521 3.175,2.281 4.445,2.281 4.445,1.521 3.175,1.521 ; 3.175,2.791 3.175,3.551 4.445,3.551 4.445,2.791 3.175,2.791 ; 3.175,4.061 3.175,4.821 4.445,4.821 4.445,4.061 3.175,4.061